# Altium footprint library 7-Connectors-8.PcbLib: 18 footprints (part 1 of 2)
Each footprint in its own frame and in the unit in brackets; x right, y up, seen from the top. Pads: shape width x height; smd on the part's side, far side on the other; paste and mask are expansions set on the pad; w line width, h text height; cw(c..) or ccw(c..) is an arc to the next point about the centre after c.
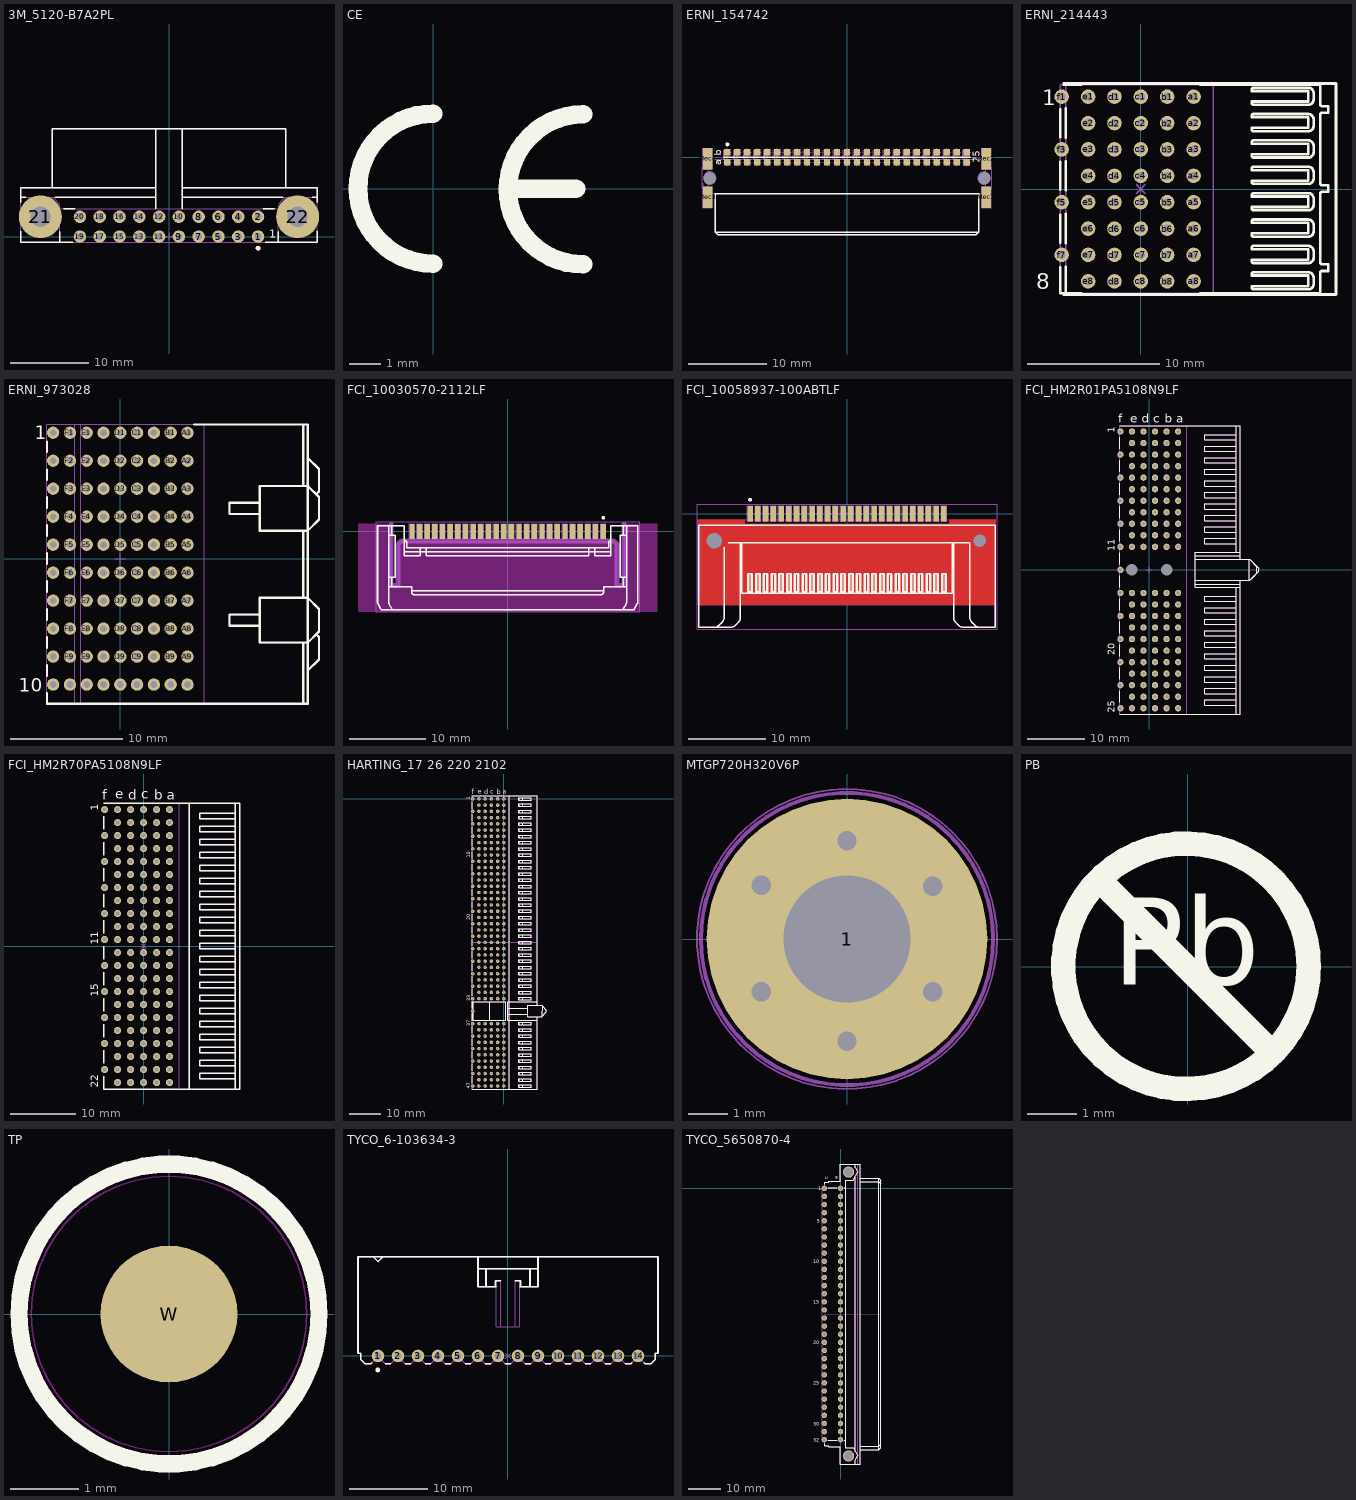
[diagram p0: the footprints below, top view; thin cyan lines are the x and y axes]

## 3M_5120-B7A2PL [mm] "20 Contacts - Right Angle .100\" x .100\" Polarized Boardmount Socket, 5100 Series"
height 8.4
pads (22):
  round 1.6 hole 0.9: 1(11.43,0) 2(11.43,2.54) 3(8.89,0) 4(8.89,2.54) 5(6.35,0) 6(6.35,2.54) 7(3.81,0) 8(3.81,2.54) 9(1.27,0) 10(1.27,2.54) 11(-1.27,0) 12(-1.27,2.54) 13(-3.81,0) 14(-3.81,2.54) 15(-6.35,0) 16(-6.35,2.54) 17(-8.89,0) 18(-8.89,2.54) 19(-11.43,0) 20(-11.43,2.54)
  round 5.5 hole 2.6: 21(-16.5,2.54) 22(16.5,2.54)
Top Overlay:
  circle w0.3: c11.43,-1.486 r0.15
  lines w0.2: -19.05,0.691 -19.05,-0.76 -12.359,-0.76 ; -19.05,4.389 -19.05,6.24 -1.7,6.24 ; -19.05,5.04 -18.416,5.04 ; -15,6.24 -15,13.84 15,13.84 15,6.24 ; -14.584,5.04 -1.7,5.04 ; -14,-0.76 -14,0.624 ; -13.513,3.54 -12.093,3.54 ; -1.7,3.54 -1.7,13.84 ; 1.7,3.54 1.7,13.84 ; 1.7,5.04 14.584,5.04 ; 1.7,6.24 19.05,6.24 19.05,4.389 ; 12.093,3.54 13.513,3.54 ; 12.359,-0.76 19.05,-0.76 19.05,0.691 ; 14,-0.76 14,0.624 ; 18.416,5.04 19.05,5.04
  text "1" at 12.835,-0.142 h1.02
Mechanical 8:
  lines w0.1: -17,2.54 -16.5,2.54 ; -16.5,2.04 -16.5,2.54 ; -16.5,3.04 -16.5,2.54 ; -16,2.54 -16.5,2.54 ; -11.93,0 -11.43,0 ; -11.93,2.54 -11.43,2.54 ; -11.43,-0.5 -11.43,0 ; -11.43,0.5 -11.43,0 ; -11.43,2.04 -11.43,2.54 ; -11.43,3.04 -11.43,2.54 ; -10.93,0 -11.43,0 ; -10.93,2.54 -11.43,2.54 ; -9.39,0 -8.89,0 ; -9.39,2.54 -8.89,2.54 ; -8.89,-0.5 -8.89,0 ; -8.89,0.5 -8.89,0 ; -8.89,2.04 -8.89,2.54 ; -8.89,3.04 -8.89,2.54 ; -8.39,0 -8.89,0 ; -8.39,2.54 -8.89,2.54 ; -6.85,0 -6.35,0 ; -6.85,2.54 -6.35,2.54 ; -6.35,-0.5 -6.35,0 ; -6.35,0.5 -6.35,0 ; -6.35,2.04 -6.35,2.54 ; -6.35,3.04 -6.35,2.54 ; -5.85,0 -6.35,0 ; -5.85,2.54 -6.35,2.54 ; -4.31,0 -3.81,0 ; -4.31,2.54 -3.81,2.54 ; -3.81,-0.5 -3.81,0 ; -3.81,0.5 -3.81,0 ; -3.81,2.04 -3.81,2.54 ; -3.81,3.04 -3.81,2.54 ; -3.31,0 -3.81,0 ; -3.31,2.54 -3.81,2.54 ; -1.77,0 -1.27,0 ; -1.77,2.54 -1.27,2.54 ; -1.27,-0.5 -1.27,0 ; -1.27,0.5 -1.27,0 ; -1.27,2.04 -1.27,2.54 ; -1.27,3.04 -1.27,2.54 ; -0.77,0 -1.27,0 ; -0.77,2.54 -1.27,2.54 ; -0.5,0 0,0 ; 0,-0.5 0,0 ; 0,0.5 0,0 ; 0.5,0 0,0 ; 0.77,0 1.27,0 ; 0.77,2.54 1.27,2.54 ; 1.27,-0.5 1.27,0 ; 1.27,0.5 1.27,0 ; 1.27,2.04 1.27,2.54 ; 1.27,3.04 1.27,2.54 ; 1.77,0 1.27,0 ; 1.77,2.54 1.27,2.54 ; 3.31,0 3.81,0 ; 3.31,2.54 3.81,2.54 ; 3.81,-0.5 3.81,0 ; 3.81,0.5 3.81,0 ; 3.81,2.04 3.81,2.54 ; 3.81,3.04 3.81,2.54 ; 4.31,0 3.81,0 ; 4.31,2.54 3.81,2.54 ; 5.85,0 6.35,0 ; 5.85,2.54 6.35,2.54 ; 6.35,-0.5 6.35,0 ; 6.35,0.5 6.35,0 ; 6.35,2.04 6.35,2.54 ; 6.35,3.04 6.35,2.54 ; 6.85,0 6.35,0 ; 6.85,2.54 6.35,2.54 ; 8.39,0 8.89,0 ; 8.39,2.54 8.89,2.54 ; 8.89,-0.5 8.89,0 ; 8.89,0.5 8.89,0 ; 8.89,2.04 8.89,2.54 ; 8.89,3.04 8.89,2.54 ; 9.39,0 8.89,0 ; 9.39,2.54 8.89,2.54 ; 10.93,0 11.43,0 ; 10.93,2.54 11.43,2.54 ; 11.43,-0.5 11.43,0 ; 11.43,0.5 11.43,0 ; 11.43,2.04 11.43,2.54 ; 11.43,3.04 11.43,2.54 ; 11.93,0 11.43,0 ; 11.93,2.54 11.43,2.54 ; 16,2.54 16.5,2.54 ; 16.5,2.04 16.5,2.54 ; 16.5,3.04 16.5,2.54 ; 17,2.54 16.5,2.54
Mechanical 14:
  circle w0.3: c11.43,-1.486 r0.15
  lines w0.1: -19.05,5.04 -1.7,5.04 ; -17.77,5.04 -17.77,2.54 ccw(c-16.5,2.54) -15.23,2.54 -15.23,5.016 ; -15.5,5.04 cw(c-15.5,3.54) -14,3.54 ; -15,6.24 -15,13.84 15,13.84 15,6.24 ; -14,-0.76 -14,3.54 ; -1.7,3.54 -1.7,13.84 ; -1.7,6.24 -19.05,6.24 -19.05,-0.76 19.05,-0.76 19.05,6.24 1.7,6.24 ; 1.7,3.54 1.7,13.84 ; 1.7,5.04 19.05,5.04 ; 14,-0.76 14,3.54 ; 15.23,5.016 15.23,2.54 ccw(c16.5,2.54) 17.77,2.54 17.77,5.04 ; 15.5,5.04 ccw(c15.5,3.54) 14,3.54 ; -14,3.54 14,3.54
  text "1" at 12.835,-0.142 h1.02
3D body "3M_5120-B7A2PL.stp": height 8.4, standoff -2.6, extent -19.05,-0.76 19.05,13.84

## CE [mm]
Top Overlay:
  lines w0.6: 0,-2.413 cw(c0,0) 0,2.413 ; 2.53,0 4.6,0 ; 4.826,-2.438 cw(c4.826,-0.025) 4.826,2.388
3D body "ce.stp": height 0.02, standoff 0, extent -2.725,-2.725 4.82,2.725

## ERNI_154742 [mm] "50 Contacts Pitch 1.27  SMC Right Angle Female Connector Type Q"
height 3.85
pads (56):
  rect 0.8x0.8 smd: A1(-15.24,-0.635) A2(-13.97,-0.635) A3(-12.7,-0.635) A4(-11.43,-0.635) A5(-10.16,-0.635) A6(-8.89,-0.635) A7(-7.62,-0.635) A8(-6.35,-0.635) A9(-5.08,-0.635) A10(-3.81,-0.635) A11(-2.54,-0.635) A12(-1.27,-0.635) A13(0,-0.635) A14(1.27,-0.635) A15(2.54,-0.635) A16(3.81,-0.635) A17(5.08,-0.635) A18(6.35,-0.635) A19(7.62,-0.635) A20(8.89,-0.635) A21(10.16,-0.635) A22(11.43,-0.635) A23(12.7,-0.635) A24(13.97,-0.635) A25(15.24,-0.635) B1(-15.24,0.635) B2(-13.97,0.635) B3(-12.7,0.635) B4(-11.43,0.635) B5(-10.16,0.635) B6(-8.89,0.635) B7(-7.62,0.635) B8(-6.35,0.635) B9(-5.08,0.635) B10(-3.81,0.635) B11(-2.54,0.635) B12(-1.27,0.635) B13(0,0.635) B14(1.27,0.635) B15(2.54,0.635) B16(3.81,0.635) B17(5.08,0.635) B18(6.35,0.635) B19(7.62,0.635) B20(8.89,0.635) B21(10.16,0.635) B22(11.43,0.635) B23(12.7,0.635) B24(13.97,0.635) B25(15.24,0.635)
  rect 1.2x2.7 smd: Mec1(17.75,-5.085) Mec2(17.75,-0.185) Mec3(-17.75,-5.085) Mec4(-17.75,-0.185)
  round 1 hole 1.6 unplated mask+0.3: Mec5(17.45,-2.635) Mec6(-17.45,-2.635)
Top Overlay:
  circle w0.25: c-15.241,1.651 r0.125
  lines w0.2: -16.851,-4.635 16.851,-4.635 ; -16.751,-4.635 -16.751,-9.535 -16.45,-9.835 16.45,-9.835 16.75,-9.535 ; -16.75,-9.535 16.75,-9.535 ; -15.71,-0.005 15.7,-0.005 ; 16.75,-4.635 16.75,-9.535
  text "b" at -15.991,0.235 h0.9
  text "a" at -15.991,-1.035 h0.9
  text "25" at 16.894,-0.7 h0.9
Mechanical 8:
  drawing of 254 lines, arcs and shapes, not listed
Mechanical 14:
  drawing of 164 lines, arcs and shapes, not listed
  text "a" at -15.991,-1.035 h0.9
  text "b" at -15.991,0.235 h0.9
  text "a1" at -15.758,-2.469 h0.9
  text "a25" at 13.869,-2.506 h1
3D body "ERNI_154742.stp": height 3.86, standoff -0.74, extent -18.416,-9.835 18.416,0.965

## ERNI_214443 [mm] "40+4 Contacts, 5 Rows  (a,b,c,d,e) of 8 positions + 1 Shield Row (f) of  4 Positions, Pitch 2 mm,  Press-Fit, Right Angle Ermet B8 CompactPCI Express Female Connector"
height 11.4
pads (44):
  round 1.1 hole 0.6: a1(4,7) a2(4,5) a3(4,3) a4(4,1) a5(4,-1) a6(4,-3) a7(4,-5) a8(4,-7) b1(2,7) b2(2,5) b3(2,3) b4(2,1) b5(2,-1) b6(2,-3) b7(2,-5) b8(2,-7) c1(0,7) c2(0,5) c3(0,3) c4(0,1) c5(0,-1) c6(0,-3) c7(0,-5) c8(0,-7) d1(-2,7) d2(-2,5) d3(-2,3) d4(-2,1) d5(-2,-1) d6(-2,-3) d7(-2,-5) d8(-2,-7) e1(-4,7) e2(-4,5) e3(-4,3) e4(-4,1) e5(-4,-1) e6(-4,-3) e7(-4,-5) e8(-4,-7) f1(-6,7) f3(-6,3) f5(-6,-1) f7(-6,-5)
Top Overlay:
  lines w0.2: -6.109,-5.944 -6.109,-7.915 -4.515,-7.915 ; -6.109,-4.056 -6.109,-1.944 ; -6.109,-0.056 -6.109,2.056 ; -6.109,3.944 -6.109,6.056 ; -5.849,-7.915 -5.849,-8 14.801,-8 14.801,8 -5.849,8 -5.849,7.915 ; -5.744,7.915 -4.515,7.915 ; -5.689,-7.915 -5.689,-5.898 ; -5.689,-4.102 -5.689,-1.898 ; -5.689,-0.102 -5.689,2.102 ; -5.689,3.898 -5.689,6.102 ; -5.689,7.898 -5.689,7.915 ; 4.515,-7.915 13.601,-7.915 13.601,-6.365 cw(c13.751,-6.365) 13.738,-6.216 14.218,-6.215 14.218,-5.715 13.751,-5.715 cw(c13.751,-5.565) 13.601,-5.565 13.601,-0.365 cw(c13.751,-0.365) 13.751,-0.215 14.218,-0.215 14.218,0.285 13.751,0.285 cw(c13.751,0.435) 13.601,0.435 13.601,5.635 cw(c13.751,5.635) 13.751,5.785 14.218,5.785 14.218,6.285 13.751,6.285 cw(c13.751,6.435) 13.601,6.435 13.601,7.915 4.515,7.915 ; 8.423,-7.49 ccw(c8.548,-7.49) 8.548,-7.615 12.701,-7.615 ccw(c12.701,-7.215) 13.101,-7.215 13.101,-6.715 ccw(c12.701,-6.715) 12.701,-6.315 8.548,-6.315 ccw(c8.548,-6.44) 8.423,-6.44 8.423,-6.565 12.701,-6.565 12.701,-7.365 8.423,-7.365 8.423,-7.49 ; 8.423,-5.49 ccw(c8.548,-5.49) 8.548,-5.615 12.701,-5.615 ccw(c12.701,-5.215) 13.101,-5.215 13.101,-4.715 ccw(c12.701,-4.715) 12.701,-4.315 8.548,-4.315 ccw(c8.548,-4.44) 8.423,-4.44 8.423,-4.565 12.701,-4.565 12.701,-5.365 8.423,-5.365 8.423,-5.49 ; 8.423,-3.49 ccw(c8.548,-3.49) 8.548,-3.615 12.701,-3.615 ccw(c12.701,-3.215) 13.101,-3.215 13.101,-2.715 ccw(c12.701,-2.715) 12.701,-2.315 8.548,-2.315 ccw(c8.548,-2.44) 8.423,-2.44 8.423,-2.565 12.701,-2.565 12.701,-3.365 8.423,-3.365 8.423,-3.49 ; 8.423,-1.49 ccw(c8.548,-1.49) 8.548,-1.615 12.701,-1.615 ccw(c12.701,-1.215) 13.101,-1.215 13.101,-0.715 ccw(c12.701,-0.715) 12.701,-0.315 8.548,-0.315 ccw(c8.548,-0.44) 8.423,-0.44 8.423,-0.565 12.701,-0.565 12.701,-1.365 8.423,-1.365 8.423,-1.49 ; 8.423,0.51 ccw(c8.548,0.51) 8.548,0.385 12.701,0.385 ccw(c12.701,0.785) 13.101,0.785 13.101,1.285 ccw(c12.701,1.285) 12.701,1.685 8.548,1.685 ccw(c8.548,1.56) 8.423,1.56 8.423,1.435 12.701,1.435 12.701,0.635 8.423,0.635 8.423,0.51 ; 8.423,2.51 ccw(c8.548,2.51) 8.548,2.385 12.701,2.385 ccw(c12.701,2.785) 13.101,2.785 13.101,3.285 ccw(c12.701,3.285) 12.701,3.685 8.548,3.685 ccw(c8.548,3.56) 8.423,3.56 8.423,3.435 12.701,3.435 12.701,2.635 8.423,2.635 8.423,2.51 ; 8.423,4.51 ccw(c8.548,4.51) 8.548,4.385 12.701,4.385 ccw(c12.701,4.785) 13.101,4.785 13.101,5.285 ccw(c12.701,5.285) 12.701,5.685 8.548,5.685 ccw(c8.548,5.56) 8.423,5.56 8.423,5.435 12.701,5.435 12.701,4.635 8.423,4.635 8.423,4.51 ; 8.423,6.51 ccw(c8.548,6.51) 8.548,6.385 12.701,6.385 ccw(c12.701,6.785) 13.101,6.785 13.101,7.285 ccw(c12.701,7.285) 12.701,7.685 8.548,7.685 ccw(c8.548,7.56) 8.423,7.56 8.423,7.435 12.701,7.435 12.701,6.635 8.423,6.635 8.423,6.51
  text "8" at -7.95,-7.6 h1.2
  text "1" at -7.475,6.35 h1.2
Mechanical 8:
  drawing of 180 lines, arcs and shapes, not listed
Mechanical 14:
  lines w0.1: -5.849,-7.915 -5.849,-8 14.801,-8 14.801,8 -5.849,8 -5.849,7.915 ; -5.689,-7.915 -5.689,7.915 ; -6.109,-7.915 -6.109,7.915 13.601,7.915 13.601,6.435 ccw(c13.751,6.435) 13.751,6.285 14.218,6.285 14.218,5.785 13.751,5.785 ccw(c13.751,5.635) 13.601,5.635 13.601,0.435 ccw(c13.751,0.435) 13.751,0.285 14.218,0.285 14.218,-0.215 13.751,-0.215 ccw(c13.751,-0.365) 13.601,-0.365 13.601,-5.565 ccw(c13.751,-5.565) 13.751,-5.715 14.218,-5.715 14.218,-6.215 13.738,-6.216 ccw(c13.751,-6.365) 13.601,-6.365 13.601,-7.915 -6.109,-7.915 ; 8.423,-7.49 ccw(c8.548,-7.49) 8.548,-7.615 12.701,-7.615 ccw(c12.701,-7.215) 13.101,-7.215 13.101,-6.715 ccw(c12.701,-6.715) 12.701,-6.315 8.548,-6.315 ccw(c8.548,-6.44) 8.423,-6.44 8.423,-6.565 12.701,-6.565 12.701,-7.365 8.423,-7.365 8.423,-7.49 ; 8.423,-5.49 ccw(c8.548,-5.49) 8.548,-5.615 12.701,-5.615 ccw(c12.701,-5.215) 13.101,-5.215 13.101,-4.715 ccw(c12.701,-4.715) 12.701,-4.315 8.548,-4.315 ccw(c8.548,-4.44) 8.423,-4.44 8.423,-4.565 12.701,-4.565 12.701,-5.365 8.423,-5.365 8.423,-5.49 ; 8.423,-3.49 ccw(c8.548,-3.49) 8.548,-3.615 12.701,-3.615 ccw(c12.701,-3.215) 13.101,-3.215 13.101,-2.715 ccw(c12.701,-2.715) 12.701,-2.315 8.548,-2.315 ccw(c8.548,-2.44) 8.423,-2.44 8.423,-2.565 12.701,-2.565 12.701,-3.365 8.423,-3.365 8.423,-3.49 ; 8.423,-1.49 ccw(c8.548,-1.49) 8.548,-1.615 12.701,-1.615 ccw(c12.701,-1.215) 13.101,-1.215 13.101,-0.715 ccw(c12.701,-0.715) 12.701,-0.315 8.548,-0.315 ccw(c8.548,-0.44) 8.423,-0.44 8.423,-0.565 12.701,-0.565 12.701,-1.365 8.423,-1.365 8.423,-1.49 ; 8.423,0.51 ccw(c8.548,0.51) 8.548,0.385 12.701,0.385 ccw(c12.701,0.785) 13.101,0.785 13.101,1.285 ccw(c12.701,1.285) 12.701,1.685 8.548,1.685 ccw(c8.548,1.56) 8.423,1.56 8.423,1.435 12.701,1.435 12.701,0.635 8.423,0.635 8.423,0.51 ; 8.423,2.51 ccw(c8.548,2.51) 8.548,2.385 12.701,2.385 ccw(c12.701,2.785) 13.101,2.785 13.101,3.285 ccw(c12.701,3.285) 12.701,3.685 8.548,3.685 ccw(c8.548,3.56) 8.423,3.56 8.423,3.435 12.701,3.435 12.701,2.635 8.423,2.635 8.423,2.51 ; 8.423,4.51 ccw(c8.548,4.51) 8.548,4.385 12.701,4.385 ccw(c12.701,4.785) 13.101,4.785 13.101,5.285 ccw(c12.701,5.285) 12.701,5.685 8.548,5.685 ccw(c8.548,5.56) 8.423,5.56 8.423,5.435 12.701,5.435 12.701,4.635 8.423,4.635 8.423,4.51 ; 8.423,6.51 ccw(c8.548,6.51) 8.548,6.385 12.701,6.385 ccw(c12.701,6.785) 13.101,6.785 13.101,7.285 ccw(c12.701,7.285) 12.701,7.685 8.548,7.685 ccw(c8.548,7.56) 8.423,7.56 8.423,7.435 12.701,7.435 12.701,6.635 8.423,6.635 8.423,6.51
  text "8" at -7.95,-7.6 h1.2
  text "1" at -7.475,6.35 h1.2
Drill Drawing:
  lines w0.1: -6.975,-8 -6.975,8 4.9,8 4.9,-8 -6.975,-8
  text "diam. 0.6mm +/-0.05" at 8.175,-8.15 h1
  text "PRESS-FIT TECHNOLOGY" at 6.575,-8.45 h1
3D body "ERNI_214443.stp": height 8.09, standoff -3.7, extent -6.109,-8.8 14.801,8

## ERNI_973028 [mm] "90 Contacts (30 pairs/10Wafer), 6 Rows  (a,b,c,d,e,f) of 10 positions + 3 Shield Row (ab, cd, ef) of  10 Positions, Pitch 2 mm,  Press-Fit, Right Angle ERmet ZD High Speed Differential Hard Metric Female Connector"
height 16.9
pads (90):
  round 1.1 hole 0.6: A1(6,11.25) A2(6,8.75) A3(6,6.25) A4(6,3.75) A5(6,1.25) A6(6,-1.25) A7(6,-3.75) A8(6,-6.25) A9(6,-8.75) A10(6,-11.25) AB1(3,11.25) AB2(3,8.75) AB3(3,6.25) AB4(3,3.75) AB5(3,1.25) AB6(3,-1.25) AB7(3,-3.75) AB8(3,-6.25) AB9(3,-8.75) AB10(3,-11.25) B1(4.5,11.25) B2(4.5,8.75) B3(4.5,6.25) B4(4.5,3.75) B5(4.5,1.25) B6(4.5,-1.25) B7(4.5,-3.75) B8(4.5,-6.25) B9(4.5,-8.75) B10(4.5,-11.25) C1(1.5,11.25) C2(1.5,8.75) C3(1.5,6.25) C4(1.5,3.75) C5(1.5,1.25) C6(1.5,-1.25) C7(1.5,-3.75) C8(1.5,-6.25) C9(1.5,-8.75) C10(1.5,-11.25) CD1(-1.5,11.25) CD2(-1.5,8.75) CD3(-1.5,6.25) CD4(-1.5,3.75) CD5(-1.5,1.25) CD6(-1.5,-1.25) CD7(-1.5,-3.75) CD8(-1.5,-6.25) CD9(-1.5,-8.75) CD10(-1.5,-11.25) D1(0,11.25) D2(0,8.75) D3(0,6.25) D4(0,3.75) D5(0,1.25) D6(0,-1.25) D7(0,-3.75) D8(0,-6.25) D9(0,-8.75) D10(0,-11.25) E1(-3,11.25) E2(-3,8.75) E3(-3,6.25) E4(-3,3.75) E5(-3,1.25) E6(-3,-1.25) E7(-3,-3.75) E8(-3,-6.25) E9(-3,-8.75) E10(-3,-11.25) EF1(-6,11.25) EF2(-6,8.75) EF3(-6,6.25) EF4(-6,3.75) EF5(-6,1.25) EF6(-6,-1.25) EF7(-6,-3.75) EF8(-6,-6.25) EF9(-6,-8.75) EF10(-6,-11.25) F1(-4.5,11.25) F2(-4.5,8.75) F3(-4.5,6.25) F4(-4.5,3.75) F5(-4.5,1.25) F6(-4.5,-1.25) F7(-4.5,-3.75) F8(-4.5,-6.25) F9(-4.5,-8.75) F10(-4.5,-11.25)
Top Overlay:
  lines w0.2: -6.55,-12.025 -6.55,-12.955 16.75,-12.955 16.75,11.995 6.589,11.995 ; -6.55,-10.475 -6.55,-9.525 ; -6.55,-7.975 -6.55,-7.025 ; -6.55,-5.475 -6.55,-4.525 ; -6.55,-2.975 -6.55,-2.025 ; -6.55,-0.475 -6.55,0.475 ; -6.55,2.025 -6.55,2.975 ; -6.55,4.525 -6.55,5.475 ; -6.55,7.025 -6.55,7.975 ; -6.55,9.525 -6.55,10.475 ; 12.45,-6 9.75,-6 9.75,-5 12.45,-5 ; 12.45,4 9.75,4 9.75,5 12.45,5 ; 16.35,6.5 16.35,11.995 ; 16.351,-12.955 16.351,-7.5 ; 16.351,-3.5 16.351,2.5 ; 16.75,-10 17.75,-9 17.75,-7 17.5,-6.75 ; 16.75,9 17.75,8 17.75,6 17.5,5.75 ; 12.45,-7.5 16.75,-7.5 17.75,-6.5 17.75,-4.5 16.75,-3.5 12.45,-3.5 12.45,-7.5 ; 12.45,2.5 16.75,2.5 17.75,3.5 17.75,5.5 16.75,6.5 12.45,6.5 12.45,2.5
  text "10" at -9.05,-11.875 h1.2
  text "1" at -7.65,10.675 h1.2
Mechanical 8:
  drawing of 366 lines, arcs and shapes, not listed
Mechanical 14:
  lines w0.1: -4.05,-12.955 -4.05,11.995 ; -3.55,-12.955 -3.55,11.995 ; 12.45,-6 9.75,-6 9.75,-5 12.45,-5 ; 12.45,4 9.75,4 9.75,5 12.45,5 ; 16.35,6.5 16.35,11.995 ; 16.351,-12.955 16.351,-7.5 ; 16.351,-3.5 16.351,2.5 ; 16.75,-10 17.75,-9 17.75,-7 17.5,-6.75 ; 16.75,9 17.75,8 17.75,6 17.5,5.75 ; -6.55,-12.955 16.75,-12.955 16.75,11.995 -6.55,11.995 -6.55,-12.955 ; 12.45,-7.5 16.75,-7.5 17.75,-6.5 17.75,-4.5 16.75,-3.5 12.45,-3.5 12.45,-7.5 ; 12.45,2.5 16.75,2.5 17.75,3.5 17.75,5.5 16.75,6.5 12.45,6.5 12.45,2.5
  text "10" at -9.05,-11.875 h1.2
  text "1" at -7.65,10.675 h1.2
Drill Drawing:
  lines w0.1: -6.55,-12.005 -6.55,11.995 ; -6.55,-12 6.815,-12 6.815,12 -6.55,12
  text "diam. 0.6mm +/-0.05" at 9.875,-8.35 h1
  text "PRESS-FIT TECHNOLOGY" at 8.265,-8.75 h1
3D body "ERNI_973028.stp": height 12.2, standoff -4.7, extent -6.55,-12.955 17.75,11.995

## FCI_10030570-2112LF [mm] "26 Contacts, Pitch 1mm, Surface Mount Card Edge ExpressCard Module Connector"
height 2.13
pads (26):
  rect 0.7x2 smd: 1(12.5,0) 2(11.5,0) 3(10.5,0) 4(9.5,0) 5(8.5,0) 6(7.5,0) 7(6.5,0) 8(5.5,0) 9(4.5,0) 10(3.5,0) 11(2.5,0) 12(1.5,0) 13(0.5,0) 14(-0.5,0) 15(-1.5,0) 16(-2.5,0) 17(-3.5,0) 18(-4.5,0) 19(-5.5,0) 20(-6.5,0) 21(-7.5,0) 22(-8.5,0) 23(-9.5,0) 24(-10.5,0) 25(-11.5,0) 26(-12.5,0)
Top Overlay:
  circle w0.25: c12.5,1.8 r0.125
  lines w0.2: -15.55,-7.25 -12.55,-7.25 -12.55,-7.95 ccw(c-12.25,-7.95) -12.25,-8.25 12.25,-8.25 ccw(c12.25,-7.95) 12.55,-7.95 12.55,-7.25 15.55,-7.25 ; -15.55,0.75 -15.55,-0.5 ; -15.15,-7.25 -15.15,-6 ; -15.15,-0.5 -15.15,0.75 ; -14.935,-10.25 cw(c-14.935,-10.05) -15.108,-10.15 -15.5,-9.471 cw(c-15.161,-9.278) -15.55,-9.25 -15.55,-6 ; -13.5,-2.65 13.5,-2.65 ; -12.55,-7.75 12.55,-7.75 ; -11.4,-2.15 -11.4,-3.15 -13.5,-3.15 -13.5,-1 ; -10.6,-2.15 -10.6,-3.15 10.6,-3.15 10.6,-2.15 ; 11.4,-2.15 11.4,-3.15 13.5,-3.15 13.5,-1 ; 14.935,-10.25 ccw(c14.935,-10.05) 15.108,-10.15 15.5,-9.471 ccw(c15.161,-9.278) 15.55,-9.25 15.55,-6 ; 15.15,-7.25 15.15,-6 ; 15.15,-0.5 15.15,0.75 ; 15.55,0.75 15.55,-0.5 ; -15.55,-6 -15.55,-0.5 ; -15.55,-6 -14.7,-6 -14.7,-0.5 -15.55,-0.5 ; -13.5,-1 ccw(c-13.25,-1) -13.25,-1.25 -13.2,-1.25 -13.2,-2.15 13.2,-2.15 13.2,-1.25 13.25,-1.25 ccw(c13.25,-1) 13.5,-1 ; -13.5,-1 -13.5,0.75 -17,0.75 -17,-9.33 ccw(c-16.8,-9.33) -16.973,-9.43 -16.558,-10.15 ccw(c-16.385,-10.05) -16.385,-10.25 16.385,-10.25 ccw(c16.385,-10.05) 16.558,-10.15 16.973,-9.43 ccw(c16.8,-9.33) 17,-9.33 17,0.75 13.5,0.75 13.5,-1 ; 15.55,-6 14.7,-6 14.7,-0.5 15.55,-0.5 ; 15.55,-6 15.55,-0.5
Keep-Out Layer:
  board cut-out: 19.55,-10.5 -19.55,-10.5 -19.55,1 -15.2,1 -15.2,-7.05 -14.3,-7.05 -14.3,-1.85 -14.3,-1.731 -14.209,-1.51 -14.04,-1.341 -13.819,-1.25 13.819,-1.25 14.04,-1.341 14.209,-1.51 14.3,-1.731 14.3,-1.85 14.3,-7.05 15.2,-7.05 15.2,1 19.55,1
Mechanical 1:
  lines w0.635: -15.2,1 -15.2,-7.05 -14.3,-7.05 -14.3,-1.85 cw(c-13.7,-1.85) -13.7,-1.25 13.7,-1.25 cw(c13.7,-1.85) 14.3,-1.85 14.3,-7.05 15.2,-7.05 15.2,1
Mechanical 8:
  drawing of 186 lines, arcs and shapes, not listed
Mechanical 14:
  lines w0.1: -15.55,-7.25 -12.55,-7.25 -12.55,-7.95 ccw(c-12.25,-7.95) -12.25,-8.25 12.25,-8.25 ccw(c12.25,-7.95) 12.55,-7.95 12.55,-7.25 15.55,-7.25 ; -15.55,0.75 -15.55,-0.5 ; -15.15,-7.25 -15.15,-6 ; -15.15,-0.5 -15.15,0.75 ; -14.935,-10.25 cw(c-14.935,-10.05) -15.108,-10.15 -15.5,-9.471 cw(c-15.161,-9.278) -15.55,-9.25 -15.55,-6 ; -13.5,-2.65 13.5,-2.65 ; -12.55,-7.75 12.55,-7.75 ; -11.4,-2.15 -11.4,-3.15 -13.5,-3.15 -13.5,-1 ; -10.6,-2.15 -10.6,-3.15 10.6,-3.15 10.6,-2.15 ; 11.4,-2.15 11.4,-3.15 13.5,-3.15 13.5,-1 ; 14.935,-10.25 ccw(c14.935,-10.05) 15.108,-10.15 15.5,-9.471 ccw(c15.161,-9.278) 15.55,-9.25 15.55,-6 ; 15.15,-7.25 15.15,-6 ; 15.15,-0.5 15.15,0.75 ; 15.55,0.75 15.55,-0.5 ; -15.55,-6 -15.55,-0.5 ; -15.55,-6 -14.7,-6 -14.7,-0.5 -15.55,-0.5 ; -13.5,-1 ccw(c-13.25,-1) -13.25,-1.25 -13.2,-1.25 -13.2,-2.15 13.2,-2.15 13.2,-1.25 13.25,-1.25 ccw(c13.25,-1) 13.5,-1 ; -13.5,-1 -13.5,0.75 -17,0.75 -17,-9.33 ccw(c-16.8,-9.33) -16.973,-9.43 -16.558,-10.15 ccw(c-16.385,-10.05) -16.385,-10.25 16.385,-10.25 ccw(c16.385,-10.05) 16.558,-10.15 16.973,-9.43 ccw(c16.8,-9.33) 17,-9.33 17,0.75 13.5,0.75 13.5,-1 ; 15.55,-6 14.7,-6 14.7,-0.5 15.55,-0.5 ; 15.55,-6 15.55,-0.5
Mechanical 15:
  lines w0.05: -17.25,-10.5 17.25,-10.5 17.25,1.25 -17.25,1.25 -17.25,-10.5
Drill Drawing:
  lines w0.1: -15.2,0 -15.2,2 ; -14.3,-5.45 -14.3,-3.45 ; -14.26,0.658 -15.2,1 ; -14.26,1.342 -15.2,1 ; -13.702,-2.332 -14.124,-1.426 ; -13.36,-4.792 -14.3,-4.45 ; -13.36,-4.108 -14.3,-4.45 ; -13.218,-1.848 -14.124,-1.426 ; -11.2,-2.877 -12.673,-2.877 -14.124,-1.426 ; -4.1,1 -15.2,1 ; 3.116,1 15.2,1 ; 8.174,-4.45 -14.3,-4.45 ; 10.438,-7.05 13.7,-7.05 ; 10.438,-1.25 13.7,-1.25 ; 11.095,-6.11 11.438,-7.05 ; 11.095,-2.19 11.438,-1.25 ; 11.78,-6.11 11.438,-7.05 ; 11.78,-2.19 11.438,-1.25 ; 12.26,-4.45 14.3,-4.45 ; 13.36,-4.792 14.3,-4.45 ; 13.36,-4.108 14.3,-4.45 ; 14.26,0.658 15.2,1 ; 14.26,1.342 15.2,1 ; 14.3,-5.45 14.3,-3.45 ; 15.2,0 15.2,2 ; 15.8,-7.05 19.663,-7.05 ; 15.8,1 19.663,1 ; 18.32,-6.11 18.663,-7.05 ; 18.32,0.06 18.663,1 ; 19.005,-6.11 18.663,-7.05 ; 19.005,0.06 18.663,1 ; 11.438,-7.05 11.438,-1.25 ; 18.663,-7.05 18.663,1
  text "+0" at 16.6,-2 h1
  text "-0.1" at 17.9,-2 h1
  text "8.05" at 18.425,-5.225 h1
  text "+" at -0.493,0.15 h1
  text "-0.1" at -0.493,0.947 h1
  text "30.4" at 2.65,1.65 h1
  text "+" at -0.827,-6.311 h1
  text "-0.05" at -0.827,-5.539 h1
  text "28.6" at 2.2,-4.825 h1
  text "+0" at 8.823,-3.734 h1
  text "-0.1" at 10.148,-3.709 h1
  text "5.8" at 11.05,-5.8 h1
  text "r0.6" at -8.4,-2.4 h1
3D body "FCI_10030570-2112LF.stp": height 2.33, standoff -2.67, extent -17,-10.25 17,0.75
